# Altium footprint library CPU_STM.PcbLib: 216 footprints (part 10 of 15)
Each footprint in its own frame and in the unit in brackets; x right, y up, seen from the top. Pads: shape width x height; smd on the part's side, far side on the other; paste and mask are expansions set on the pad; w line width, h text height; cw(c..) or ccw(c..) is an arc to the next point about the centre after c.
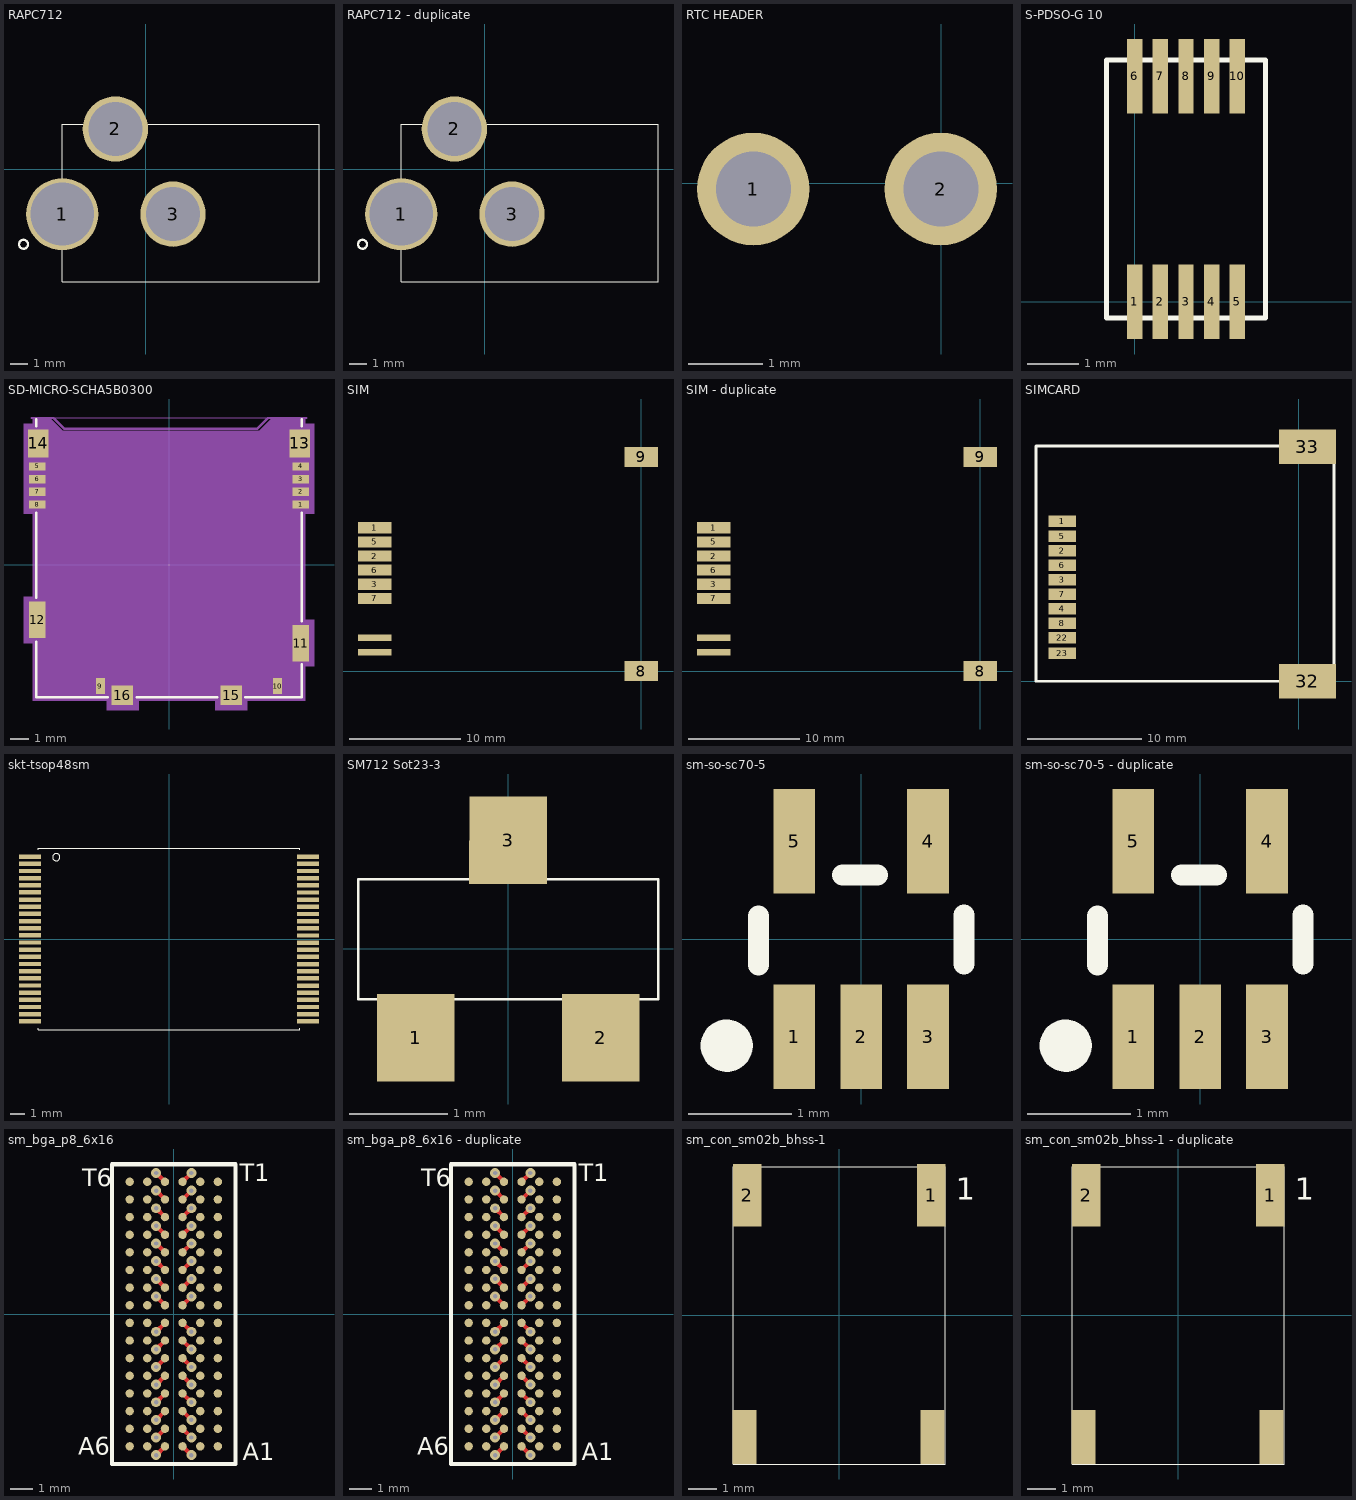
[diagram p9: the footprints below, top view; thin cyan lines are the x and y axes]

## RAPC712 [mil] "RAPC712"
pads (3):
  round 160 hole 140: 1(-185,-100)
  round 145 hole 120: 2(-67,89) 3(61,-100)
Top Overlay:
  circle w5: c-271,-167 r10
  lines w1: -185,-250 -185,100 385,100 385,-250 -185,-250

## RAPC712 - duplicate [mil] "RAPC712"
pads (3):
  round 160 hole 140: 1(-185,-100)
  round 145 hole 120: 2(-67,89) 3(61,-100)
Top Overlay:
  circle w5: c-271,-167 r10
  lines w1: -185,-250 385,-250 385,100 -185,100 -185,-250

## RTC HEADER [mil]
pads (2):
  round 60 hole 40: 1(-100.39,-2.95) 2(-0.39,-2.95)
3D body "RTC TH.STEP": height 401.57, standoff -39.37, extent -110.23,-50.9 0,31.5

## S-PDSO-G 10 [mm]
pads (10):
  rect 0.3x1.45 smd mask+0.05: 1(0,0) 2(0.5,0) 3(1,0) 4(1.5,0) 5(2,0) 6(0,4.4) 7(0.5,4.4) 8(1,4.4) 9(1.5,4.4) 10(2,4.4)
Top Overlay:
  lines w0.1: 2.55,-0.318 -0.55,-0.318 -0.55,4.718 2.55,4.718 2.55,-0.318 ; 2.55,-0.318 2.55,-0.318
3D body "User Library-DGQ (S-PDSO-G10).STEP": height 1.1, standoff 0, extent -0.55,-0.318 2.55,4.718

## SD-MICRO-SCHA5B0300 [mil] "SD-MICRO-SCHA5B0300"
pads (16):
  rect 36x18 smd mask+2.36: 1(285.72,130) 2(285.72,157.56) 3(285.72,185.12) 4(285.72,212.68) 5(-285.72,212.68) 6(-285.72,185.12) 7(-285.72,157.56) 8(-285.72,130)
  rect 20x35 smd mask+2.36: 9(-148.62,-263.28) 10(235.24,-263.28)
  rect 35x79 smd mask+2.36: 11(285.43,-170.59) 12(-285.43,-119.41)
  rect 44x60 smd mask+2.36: 13(283.32,262.48) 14(-283.32,262.48)
  rect 47x43 smd mask+2.36: 15(134.84,-282.91) 16(-101.37,-282.91)
Top Overlay:
  lines w5: -287.5,-167 -287.5,-287.5 -132.5,-287.5 ; -287.5,-72.5 -287.5,112.05 ; -287.5,299.5 -287.5,315 ; -70,-287.5 104.5,-287.5 ; 165.5,-287.5 287.5,-287.5 287.5,-215.5 ; 287.5,-123 287.5,113 ; 287.5,299.5 287.5,315
Mechanical 5:
  lines w5: -297.15,317.59 -250.21,317.59 -226.56,293.97 190.76,293.97 214.41,317.59 297.85,317.59
Mechanical 16:
  region: 220,315 195,290 -230,290 -255,315 -295,315 -295,305 -315,305 -315,110 -295,110 -295,-70 -315,-70 -315,-170 -295,-170 -295,-295 -135,-295 -135,-315 -65,-315 -65,-295 100,-295 100,-315 170,-315 170,-295 295,-295 295,-220 315,-220 315,-120 295,-120 295,110 315,110 315,305 295,305 295,315
  lines w1: -285,-284.82 285,-284.82 285,317.57 -285,317.57 -285,-284.82
Mechanical 32:
  text "11" at 293.3,-170.59 h9.84
  text "14" at -275.45,262.48 h9.84
  text "13" at 291.19,262.48 h9.84
  text "15" at 142.71,-282.91 h9.84
  text "12" at -277.56,-119.41 h9.84
  text "16" at -93.5,-282.91 h9.84
  text "1" at 289.66,130 h9.84
  text "8" at -281.78,130 h9.84
  text "7" at -281.78,157.56 h9.84
  text "5" at -281.78,212.68 h9.84
  text "3" at 289.66,185.12 h9.84
  text "2" at 289.66,157.56 h9.84
  text "10" at 243.11,-263.28 h9.84
  text "9" at -144.68,-263.28 h9.84
  text "6" at -281.78,185.12 h9.84
  text "4" at 289.66,212.68 h9.84
  text "X" at 92.5,52.18 h40.16
  text "X" at 92.5,52.18 h40.16
  text "SCHA5B0200" at 92.5,52.18 h40.16
3D body "SD MEM2055-00-190-01-A_revG.step": height 80.71, standoff -15.75, extent -318.9,-287.4 311.02,312.99

## SIM [mm]
pads (10):
  rect 3x1 smd mask+0.06: 1(-24,12.9) 2(-24,10.36) 3(-24,7.82) 5(-24,11.63) 6(-24,9.09) 7(-24,6.55)
  rect 3x1.8 smd mask+0.06: 8(0,0) 9(0,19.28)
  rect 3x0.6 smd mask+0.06: SW1(-24,3.01) SW2(-24,1.71)

## SIM - duplicate [mm]
pads (10):
  rect 3x1 smd mask+0.06: 1(-24,12.9) 2(-24,10.36) 3(-24,7.82) 5(-24,11.63) 6(-24,9.09) 7(-24,6.55)
  rect 3x1.8 smd mask+0.06: 8(0,0) 9(0,19.28)
  rect 3x0.6 smd mask+0.06: SW1(-24,3.01) SW2(-24,1.71)

## SIMCARD [mm]
pads (12):
  rect 2.4x1 smd mask+0.2: 1(-20.701,13.97) 2(-20.7,11.42) 3(-20.7,8.88) 4(-20.7,6.34) 5(-20.7,12.69) 6(-20.7,10.15) 7(-20.7,7.61) 8(-20.7,5.07) 22(-20.7,3.8) 23(-20.701,2.464)
  rect 5x3 smd mask+0.2: 32(0.74,0) 33(0.74,20.5)
Top Overlay:
  lines w0.254: -22.987,0 3.048,0 3.048,20.574 -22.987,20.574 -22.987,0
3D body "User Library-115A-BDA0-R01_C_1.STEP": height 1.85, standoff -0.7, extent -21.666,-0.01 4.834,20.94

## skt-tsop48sm [mil] "SKT-TSOP48SM"
pads (48):
  rect 60x12 smd mask+5.91: 1(-382.5,226.5) 2(-382.5,206.8) 3(-382.5,187.1) 4(-382.5,167.4) 5(-382.5,147.8) 6(-382.5,128.1) 7(-382.5,108.4) 8(-382.5,88.7) 9(-382.5,69) 10(-382.5,49.3) 11(-382.5,29.7) 12(-382.5,10) 13(-382.5,-9.7) 14(-382.5,-29.4) 15(-382.5,-49.1) 16(-382.5,-68.8) 17(-382.5,-88.5) 18(-382.5,-108.1) 19(-382.5,-127.8) 20(-382.5,-147.5) 21(-382.5,-167.2) 22(-382.5,-186.9) 23(-382.5,-206.6) 24(-382.5,-226.3) 25(382.5,-226.5) 26(382.5,-206.8) 27(382.5,-187.1) 28(382.5,-167.4) 29(382.5,-147.8) 30(382.5,-128.1) 31(382.5,-108.4) 32(382.5,-88.7) 33(382.5,-69) 34(382.5,-49.3) 35(382.5,-29.7) 36(382.5,-10) 37(382.5,9.7) 38(382.5,29.4) 39(382.5,49.1) 40(382.5,68.8) 41(382.5,88.5) 42(382.5,108.1) 43(382.5,127.8) 44(382.5,147.5) 45(382.5,167.2) 46(382.5,186.9) 47(382.5,206.6) 48(382.5,226.3)
Top Overlay:
  circle w1: c-310,225 r10
  lines w1: -360,-245 -360,-250 360,-250 360,-245 ; -360,245 -360,250 360,250 360,245
3D body "User Library-TSOP48-1.STEP": height 47.24, standoff 0, extent -397.64,-239.17 397.64,237.21

## SM712 Sot23-3 [mil]
pads (3):
  rect 31x35 smd: 1(-37,-35.56) 2(37,-35.56) 3(0,43.44)
Top Overlay:
  lines w1: -60,-20.06 -60,27.94 60,27.94 60,-20.06 -60,-20.06
3D body "User Library-SOT95P280X135-3M[SOT23_TO-236AA].step": height 51.18, standoff 0, extent -59.06,-55.13 59.05,62.99

## sm-so-sc70-5 [mil] "SM-SO-SC70-5"
pads (5):
  rect 16x40 smd mask+2.36: 1(-25.59,-37.4) 2(0,-37.4) 3(25.59,-37.4) 4(25.59,37.4) 5(-25.59,37.4)
Top Overlay:
  circle w10: c-51.45,-40.82 r5
  lines w8: -39.34,-10.02 -39.34,8.81 ; -7.17,24.52 6.18,24.52 ; 39.4,-9.61 39.4,9.22
3D body "SOT353-1.step": height 43.31, standoff 0, extent -43.3,-47.24 43.31,47.25

## sm-so-sc70-5 - duplicate [mil] "SM-SO-SC70-5"
pads (5):
  rect 16x40 smd mask+2.36: 1(-25.59,-37.4) 2(0,-37.4) 3(25.59,-37.4) 4(25.59,37.4) 5(-25.59,37.4)
Top Overlay:
  circle w10: c-51.45,-40.82 r5
  lines w8: -39.34,-10.02 -39.34,8.81 ; -7.17,24.52 6.18,24.52 ; 39.4,-9.61 39.4,9.22

## sm_bga_p8_6x16 [mm] "SM_BGA_P8_6X16"
pads (96):
  round 0.381 smd mask+0.06: A1(2,-6) A2(1.2,-6) A3(0.4,-6) A4(-0.4,-6) A5(-1.2,-6) A6(-2,-6) B1(2,-5.2) B2(1.2,-5.2) B3(0.4,-5.2) B4(-0.4,-5.2) B5(-1.2,-5.2) B6(-2,-5.2) C1(2,-4.4) C2(1.2,-4.4) C3(0.4,-4.4) C4(-0.4,-4.4) C5(-1.2,-4.4) C6(-2,-4.4) D1(2,-3.6) D2(1.2,-3.6) D3(0.4,-3.6) D4(-0.4,-3.6) D5(-1.2,-3.6) D6(-2,-3.6) E1(2,-2.8) E2(1.2,-2.8) E3(0.4,-2.8) E4(-0.4,-2.8) E5(-1.2,-2.8) E6(-2,-2.8) F1(2,-2) F2(1.2,-2) F3(0.4,-2) F4(-0.4,-2) F5(-1.2,-2) F6(-2,-2) G1(2,-1.2) G2(1.2,-1.2) G3(0.4,-1.2) G4(-0.4,-1.2) G5(-1.2,-1.2) G6(-2,-1.2) H1(2,-0.4) H2(1.2,-0.4) H3(0.4,-0.4) H4(-0.4,-0.4) H5(-1.2,-0.4) H6(-2,-0.4) J1(2,0.4) J2(1.2,0.4) J3(0.4,0.4) J4(-0.4,0.4) J5(-1.2,0.4) J6(-2,0.4) K1(2,1.2) K2(1.2,1.2) K3(0.4,1.2) K4(-0.4,1.2) K5(-1.2,1.2) K6(-2,1.2) L1(2,2) L2(1.2,2) L3(0.4,2) L4(-0.4,2) L5(-1.2,2) L6(-2,2) M1(2,2.8) M2(1.2,2.8) M3(0.4,2.8) M4(-0.4,2.8) M5(-1.2,2.8) M6(-2,2.8) N1(2,3.6) N2(1.2,3.6) N3(0.4,3.6) N4(-0.4,3.6) N5(-1.2,3.6) N6(-2,3.6) P1(2,4.4) P2(1.2,4.4) P3(0.4,4.4) P4(-0.4,4.4) P5(-1.2,4.4) P6(-2,4.4) R1(2,5.2) R2(1.2,5.2) R3(0.4,5.2) R4(-0.4,5.2) R5(-1.2,5.2) R6(-2,5.2) T1(2,6) T2(1.2,6) T3(0.4,6) T4(-0.4,6) T5(-1.2,6) T6(-2,6)
via 0.8,-4.8 diameter 0.45 hole 0.2
via 0.8,-2.4 diameter 0.45 hole 0.2
via 0.8,2.4 diameter 0.45 hole 0.2
via 0.8,4.8 diameter 0.45 hole 0.2
via -0.8,-4.8 diameter 0.45 hole 0.2
via -0.8,-2.4 diameter 0.45 hole 0.2
via -0.8,2.4 diameter 0.45 hole 0.2
via -0.8,4.8 diameter 0.45 hole 0.2
via -0.8,-6.4 diameter 0.45 hole 0.2
via -0.8,-0.8 diameter 0.45 hole 0.2
via -0.8,0.8 diameter 0.45 hole 0.2
via -0.8,6.4 diameter 0.45 hole 0.2
via -0.8,-5.6 diameter 0.45 hole 0.2
via -0.8,-4 diameter 0.45 hole 0.2
via -0.8,-3.2 diameter 0.45 hole 0.2
via -0.8,-1.6 diameter 0.45 hole 0.2
via -0.8,1.6 diameter 0.45 hole 0.2
via -0.8,3.2 diameter 0.45 hole 0.2
via -0.8,5.6 diameter 0.45 hole 0.2
via -0.8,4 diameter 0.45 hole 0.2
via 0.8,-6.4 diameter 0.45 hole 0.2
via 0.8,-5.6 diameter 0.45 hole 0.2
via 0.8,-4 diameter 0.45 hole 0.2
via 0.8,-3.2 diameter 0.45 hole 0.2
via 0.8,-1.6 diameter 0.45 hole 0.2
via 0.8,-0.8 diameter 0.45 hole 0.2
via 0.8,0.8 diameter 0.45 hole 0.2
via 0.8,1.6 diameter 0.45 hole 0.2
via 0.8,3.2 diameter 0.45 hole 0.2
via 0.8,6.4 diameter 0.45 hole 0.2
via 0.8,4 diameter 0.45 hole 0.2
via 0.8,5.6 diameter 0.45 hole 0.2
Top Layer:
  lines w0.2: -0.8,-6.4 -0.4,-6 ; -0.8,-5.6 -0.4,-5.2 ; -0.8,-4.8 -0.4,-4.4 ; -0.8,-4 -0.4,-3.6 ; -0.8,-3.2 -0.4,-2.8 ; -0.8,-2.4 -0.4,-2 ; -0.8,-1.6 -0.4,-1.2 ; -0.8,-0.8 -0.4,-0.4 ; -0.8,0.8 -0.4,0.4 ; -0.8,1.6 -0.4,1.2 ; -0.8,2.4 -0.4,2 ; -0.8,3.2 -0.4,2.8 ; -0.8,4 -0.4,3.6 ; -0.8,4.8 -0.4,4.4 ; -0.8,5.6 -0.4,5.2 ; -0.8,6.4 -0.4,6 ; 0.4,-6 0.8,-6.4 ; 0.4,-5.2 0.8,-5.6 ; 0.4,-4.4 0.8,-4.8 ; 0.4,-3.6 0.8,-4 ; 0.4,-2.8 0.8,-3.2 ; 0.4,-2 0.8,-2.4 ; 0.4,-1.2 0.8,-1.6 ; 0.4,-0.4 0.8,-0.8 ; 0.4,0.4 0.8,0.8 ; 0.4,1.2 0.8,1.6 ; 0.4,2 0.8,2.4 ; 0.4,2.8 0.8,3.2 ; 0.4,3.6 0.8,4 ; 0.4,4.4 0.8,4.8 ; 0.4,5.2 0.8,5.6 ; 0.4,6 0.8,6.4
Top Overlay:
  lines w0.2: -2.8,-6.8 -2.8,6.8 2.8,6.8 2.8,-6.8 -2.8,-6.8
  text "A6" at -4.343,-6.375 h0.79
  text "A1" at 3.124,-6.629 h0.79
  text "T1" at 2.997,6.02 h0.79
  text "T6" at -4.14,5.791 h0.79

## sm_bga_p8_6x16 - duplicate [mm] "SM_BGA_P8_6X16"
pads (96):
  round 0.381 smd mask+0.06: A1(2,-6) A2(1.2,-6) A3(0.4,-6) A4(-0.4,-6) A5(-1.2,-6) A6(-2,-6) B1(2,-5.2) B2(1.2,-5.2) B3(0.4,-5.2) B4(-0.4,-5.2) B5(-1.2,-5.2) B6(-2,-5.2) C1(2,-4.4) C2(1.2,-4.4) C3(0.4,-4.4) C4(-0.4,-4.4) C5(-1.2,-4.4) C6(-2,-4.4) D1(2,-3.6) D2(1.2,-3.6) D3(0.4,-3.6) D4(-0.4,-3.6) D5(-1.2,-3.6) D6(-2,-3.6) E1(2,-2.8) E2(1.2,-2.8) E3(0.4,-2.8) E4(-0.4,-2.8) E5(-1.2,-2.8) E6(-2,-2.8) F1(2,-2) F2(1.2,-2) F3(0.4,-2) F4(-0.4,-2) F5(-1.2,-2) F6(-2,-2) G1(2,-1.2) G2(1.2,-1.2) G3(0.4,-1.2) G4(-0.4,-1.2) G5(-1.2,-1.2) G6(-2,-1.2) H1(2,-0.4) H2(1.2,-0.4) H3(0.4,-0.4) H4(-0.4,-0.4) H5(-1.2,-0.4) H6(-2,-0.4) J1(2,0.4) J2(1.2,0.4) J3(0.4,0.4) J4(-0.4,0.4) J5(-1.2,0.4) J6(-2,0.4) K1(2,1.2) K2(1.2,1.2) K3(0.4,1.2) K4(-0.4,1.2) K5(-1.2,1.2) K6(-2,1.2) L1(2,2) L2(1.2,2) L3(0.4,2) L4(-0.4,2) L5(-1.2,2) L6(-2,2) M1(2,2.8) M2(1.2,2.8) M3(0.4,2.8) M4(-0.4,2.8) M5(-1.2,2.8) M6(-2,2.8) N1(2,3.6) N2(1.2,3.6) N3(0.4,3.6) N4(-0.4,3.6) N5(-1.2,3.6) N6(-2,3.6) P1(2,4.4) P2(1.2,4.4) P3(0.4,4.4) P4(-0.4,4.4) P5(-1.2,4.4) P6(-2,4.4) R1(2,5.2) R2(1.2,5.2) R3(0.4,5.2) R4(-0.4,5.2) R5(-1.2,5.2) R6(-2,5.2) T1(2,6) T2(1.2,6) T3(0.4,6) T4(-0.4,6) T5(-1.2,6) T6(-2,6)
via 0.8,-4.8 diameter 0.45 hole 0.2
via 0.8,-2.4 diameter 0.45 hole 0.2
via 0.8,2.4 diameter 0.45 hole 0.2
via 0.8,4.8 diameter 0.45 hole 0.2
via -0.8,-4.8 diameter 0.45 hole 0.2
via -0.8,-2.4 diameter 0.45 hole 0.2
via -0.8,2.4 diameter 0.45 hole 0.2
via -0.8,4.8 diameter 0.45 hole 0.2
via -0.8,-6.4 diameter 0.45 hole 0.2
via -0.8,-0.8 diameter 0.45 hole 0.2
via -0.8,0.8 diameter 0.45 hole 0.2
via -0.8,6.4 diameter 0.45 hole 0.2
via -0.8,-5.6 diameter 0.45 hole 0.2
via -0.8,-4 diameter 0.45 hole 0.2
via -0.8,-3.2 diameter 0.45 hole 0.2
via -0.8,-1.6 diameter 0.45 hole 0.2
via -0.8,1.6 diameter 0.45 hole 0.2
via -0.8,3.2 diameter 0.45 hole 0.2
via -0.8,5.6 diameter 0.45 hole 0.2
via -0.8,4 diameter 0.45 hole 0.2
via 0.8,-6.4 diameter 0.45 hole 0.2
via 0.8,-5.6 diameter 0.45 hole 0.2
via 0.8,-4 diameter 0.45 hole 0.2
via 0.8,-3.2 diameter 0.45 hole 0.2
via 0.8,-1.6 diameter 0.45 hole 0.2
via 0.8,-0.8 diameter 0.45 hole 0.2
via 0.8,0.8 diameter 0.45 hole 0.2
via 0.8,1.6 diameter 0.45 hole 0.2
via 0.8,3.2 diameter 0.45 hole 0.2
via 0.8,6.4 diameter 0.45 hole 0.2
via 0.8,4 diameter 0.45 hole 0.2
via 0.8,5.6 diameter 0.45 hole 0.2
Top Layer:
  lines w0.2: -0.8,-6.4 -0.4,-6 ; -0.8,-5.6 -0.4,-5.2 ; -0.8,-4.8 -0.4,-4.4 ; -0.8,-4 -0.4,-3.6 ; -0.8,-3.2 -0.4,-2.8 ; -0.8,-2.4 -0.4,-2 ; -0.8,-1.6 -0.4,-1.2 ; -0.8,-0.8 -0.4,-0.4 ; -0.8,0.8 -0.4,0.4 ; -0.8,1.6 -0.4,1.2 ; -0.8,2.4 -0.4,2 ; -0.8,3.2 -0.4,2.8 ; -0.8,4 -0.4,3.6 ; -0.8,4.8 -0.4,4.4 ; -0.8,5.6 -0.4,5.2 ; -0.8,6.4 -0.4,6 ; 0.4,-6 0.8,-6.4 ; 0.4,-5.2 0.8,-5.6 ; 0.4,-4.4 0.8,-4.8 ; 0.4,-3.6 0.8,-4 ; 0.4,-2.8 0.8,-3.2 ; 0.4,-2 0.8,-2.4 ; 0.4,-1.2 0.8,-1.6 ; 0.4,-0.4 0.8,-0.8 ; 0.4,0.4 0.8,0.8 ; 0.4,1.2 0.8,1.6 ; 0.4,2 0.8,2.4 ; 0.4,2.8 0.8,3.2 ; 0.4,3.6 0.8,4 ; 0.4,4.4 0.8,4.8 ; 0.4,5.2 0.8,5.6 ; 0.4,6 0.8,6.4
Top Overlay:
  lines w0.2: -2.8,-6.8 -2.8,6.8 2.8,6.8 2.8,-6.8 -2.8,-6.8
  text "A6" at -4.343,-6.375 h0.79
  text "A1" at 3.124,-6.629 h0.79
  text "T1" at 2.997,6.02 h0.79
  text "T6" at -4.14,5.791 h0.79

## sm_con_sm02b_bhss-1 [mm] "SM_CON_SM02B_BHSS-1"
pads (4):
  rect 1x2.2 smd: 1(3.25,4.25) 2(-3.25,4.25)
  rect 0.85x1.9 smd: " "(-3.35,-4.3) " "(3.3,-4.3)
Top Overlay:
  lines w0.025: -3.75,-5.25 3.75,-5.25 3.75,5.25 -3.75,5.25 -3.75,-5.25
  text "1" at 4.115,4.089 h0.79

## sm_con_sm02b_bhss-1 - duplicate [mm] "SM_CON_SM02B_BHSS-1"
pads (4):
  rect 1x2.2 smd: 1(3.25,4.25) 2(-3.25,4.25)
  rect 0.85x1.9 smd: " "(-3.35,-4.3) " "(3.3,-4.3)
Top Overlay:
  lines w0.025: -3.75,-5.25 3.75,-5.25 3.75,5.25 -3.75,5.25 -3.75,-5.25
  text "1" at 4.115,4.089 h0.79